# Altium footprint library Hydra_Ref_pcb.PcbLib: 353 footprints (part 7 of 23)
Each footprint in its own frame and in the unit in brackets; x right, y up, seen from the top. Pads: shape width x height; smd on the part's side, far side on the other; paste and mask are expansions set on the pad; w line width, h text height; cw(c..) or ccw(c..) is an arc to the next point about the centre after c.
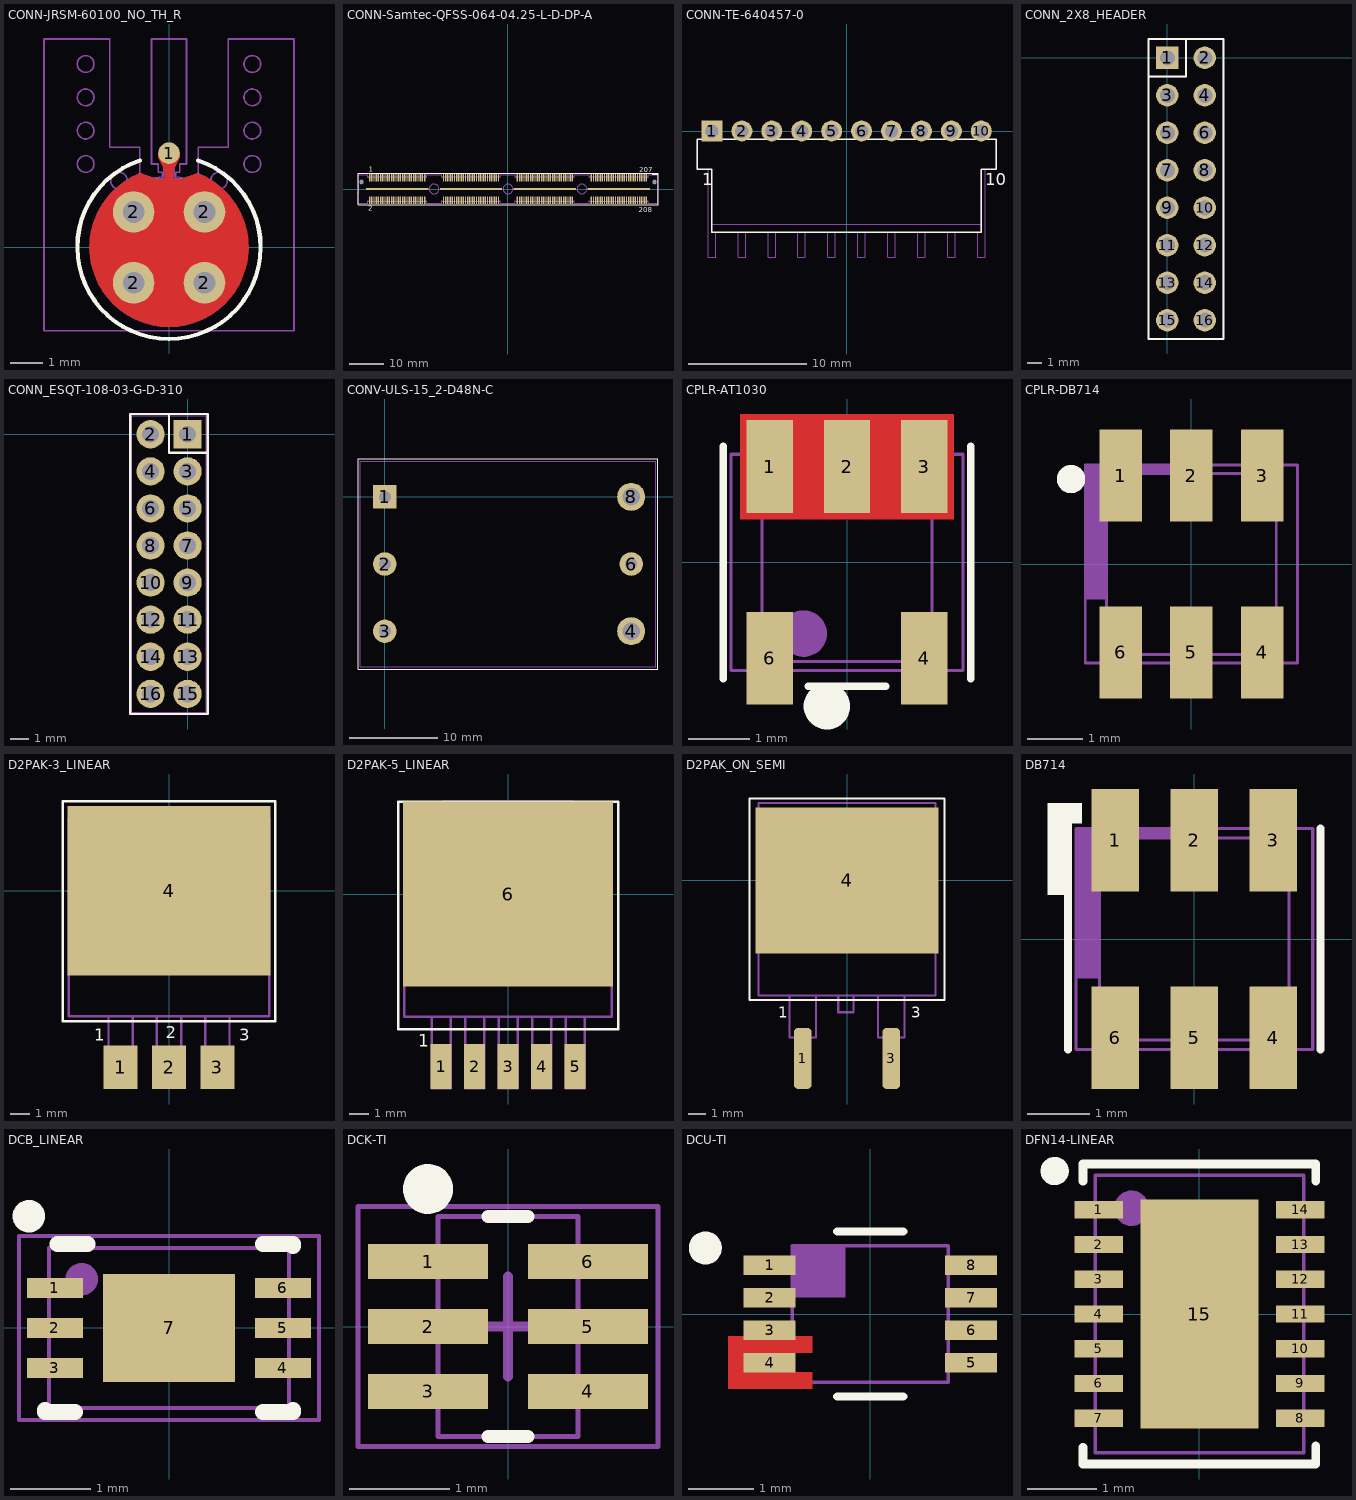
[diagram p6: the footprints below, top view; thin cyan lines are the x and y axes]

## CONN-JRSM-60100_NO_TH_R [mil] ".063\" PCB ONLY-MALE COMPANAR SURFACE MOUNT"
height 116
pads (5):
  round 26 smd paste+0 mask+4: 1(0,113)
  round 50 / inner round 40 / far side round 50 hole 26 mask-25: 2(-42.5,-42.5) 2(-42.5,42.5) 2(42.5,-42.5) 2(42.5,42.5)
Top Layer:
  pour cut-out: -13.5,21.04 -16.91,18.85 -22,12.55 -24.84,4.95 -25.13,-3.15 -22.85,-10.92 -18.23,-17.58 -11.74,-22.44 -4.05,-25 4.05,-25 11.74,-22.44 18.23,-17.58 22.85,-10.92 25.13,-3.15 24.84,4.95 22,12.55 16.91,18.85 13.5,21.04 13.5,82 -13.5,82
  region: -5,92 -13,108 -13,113 0,100 13,113 13,108 5,92 5,70 -5,70
  region: -33.87,88.76 -42.7,85.39 -58.69,75.3 -72.38,62.25 -83.23,46.77 -90.81,29.45 -94.84,10.98 -95.14,-7.93 -91.71,-26.52 -84.69,-44.07 -74.34,-59.9 -61.08,-73.37 -45.43,-83.97 -27.99,-91.27 -9.45,-95 9.45,-95 27.99,-91.27 45.43,-83.97 61.08,-73.37 74.34,-59.9 84.69,-44.07 91.71,-26.52 95.14,-7.93 94.84,10.98 90.81,29.45 83.23,46.77 72.38,62.25 58.69,75.3 42.7,85.39 33.87,88.76 33.87,88.77 13.5,82 13.5,21.04 16.69,18.61 21.72,12.38 24.52,4.89 24.81,-3.1 22.56,-10.78 17.99,-17.36 11.59,-22.15 4,-24.68 -4,-24.68 -11.59,-22.15 -17.99,-17.36 -22.56,-10.78 -24.81,-3.1 -24.52,4.89 -21.72,12.38 -16.69,18.61 -13.5,21.04 -13.5,82
  region: 33.91,88.86 53.03,79.37 67.5,67.5 79.37,53.03 88.19,36.53 93.63,18.62 95.46,0 93.63,-18.62 88.19,-36.53 79.37,-53.03 67.5,-67.5 53.03,-79.37 36.53,-88.19 18.62,-93.63 0,-95.46 -18.62,-93.63 -36.53,-88.19 -44.78,-83.78 -53.03,-79.37 -60.27,-73.44 -67.5,-67.5 -73.44,-60.27 -79.37,-53.03 -83.78,-44.78 -88.19,-36.53 -93.63,-18.62 -94.54,-9.31 -95.46,0 -93.63,18.62 -88.19,36.53 -79.37,53.03 -67.5,67.5 -53.03,79.37 -36.53,88.19 -35.24,50 -55,18.02 -55,-15 -42.5,-42.5 0,-65 42.5,-42.5 55,-13.89 55,18.62 33.96,50
Mid-Layer 6:
  pour cut-out: -53.78,70.4 -55.45,69.73 -57.17,66.56 -56.48,63.03 -53.7,60.74 -51.9,60.74 -51.66,60.74 -51.18,60.78 -50.71,60.88 -50.24,61.01 -50.02,61.1 -48.22,61.73 -44.48,62.47 -40.67,62.48 -36.92,61.77 -35.12,61.16 -34.9,61.07 -34.44,60.94 -33.98,60.85 -33.51,60.8 -33.27,60.8 -31.46,60.8 -28.68,63.11 -28,66.65 -29.74,69.82 -31.42,70.48 -34.09,71.54 -39.74,72.61 -45.48,72.58 -51.12,71.48
  pour cut-out: -14.6,53.78 -15.27,55.45 -18.44,57.17 -21.97,56.48 -24.26,53.7 -24.26,51.9 -24.26,51.66 -24.22,51.18 -24.12,50.71 -23.99,50.24 -23.9,50.02 -23.27,48.22 -22.53,44.48 -22.52,40.67 -23.23,36.92 -23.84,35.12 -23.93,34.9 -24.06,34.44 -24.15,33.98 -24.2,33.51 -24.2,33.27 -24.2,31.46 -21.89,28.68 -18.35,28 -15.18,29.74 -14.52,31.42 -13.46,34.09 -12.39,39.74 -12.42,45.48 -13.52,51.12
  pour cut-out: -31.22,14.6 -29.55,15.27 -27.83,18.44 -28.52,21.97 -31.3,24.26 -33.1,24.26 -33.34,24.26 -33.82,24.22 -34.29,24.12 -34.76,23.99 -34.98,23.9 -36.78,23.27 -40.52,22.53 -44.33,22.52 -48.08,23.23 -49.88,23.84 -50.1,23.93 -50.56,24.06 -51.02,24.15 -51.49,24.2 -51.73,24.2 -53.54,24.2 -56.32,21.89 -56.99,18.35 -55.26,15.18 -53.58,14.52 -50.91,13.46 -45.26,12.39 -39.52,12.42 -33.88,13.52
  pour cut-out: -70.4,31.22 -69.73,29.55 -66.56,27.83 -63.03,28.52 -60.74,31.3 -60.74,33.1 -60.74,33.34 -60.78,33.82 -60.88,34.29 -61.01,34.76 -61.1,34.98 -61.73,36.78 -62.47,40.52 -62.48,44.33 -61.77,48.08 -61.16,49.88 -61.07,50.1 -60.94,50.56 -60.85,51.02 -60.8,51.49 -60.8,51.73 -60.8,53.54 -63.11,56.32 -66.65,56.99 -69.82,55.26 -70.48,53.58 -71.54,50.91 -72.61,45.26 -72.58,39.52 -71.48,33.88
  pour cut-out: 31.22,70.4 29.55,69.73 27.83,66.56 28.52,63.03 31.3,60.74 33.1,60.74 33.34,60.74 33.82,60.78 34.29,60.88 34.76,61.01 34.98,61.1 36.78,61.73 40.52,62.47 44.33,62.48 48.08,61.77 49.88,61.16 50.1,61.07 50.56,60.94 51.02,60.85 51.49,60.8 51.73,60.8 53.54,60.8 56.32,63.11 56.99,66.65 55.26,69.82 53.58,70.48 50.91,71.54 45.26,72.61 39.52,72.58 33.88,71.48
  pour cut-out: 70.4,53.78 69.73,55.45 66.56,57.17 63.03,56.48 60.74,53.7 60.74,51.9 60.74,51.66 60.78,51.18 60.88,50.71 61.01,50.24 61.1,50.02 61.73,48.22 62.47,44.48 62.48,40.67 61.77,36.92 61.16,35.12 61.07,34.9 60.94,34.44 60.85,33.98 60.8,33.51 60.8,33.27 60.8,31.46 63.11,28.68 66.65,28 69.82,29.74 70.48,31.42 71.54,34.09 72.61,39.74 72.58,45.48 71.48,51.12
  pour cut-out: 53.78,14.6 55.45,15.27 57.17,18.44 56.48,21.97 53.7,24.26 51.9,24.26 51.66,24.26 51.18,24.22 50.71,24.12 50.24,23.99 50.02,23.9 48.22,23.27 44.48,22.53 40.67,22.52 36.92,23.23 35.12,23.84 34.9,23.93 34.44,24.06 33.98,24.15 33.51,24.2 33.27,24.2 31.46,24.2 28.68,21.89 28,18.35 29.74,15.18 31.42,14.52 34.09,13.46 39.74,12.39 45.48,12.42 51.12,13.52
  pour cut-out: 14.6,31.22 15.27,29.55 18.44,27.83 21.97,28.52 24.26,31.3 24.26,33.1 24.26,33.34 24.22,33.82 24.12,34.29 23.99,34.76 23.9,34.98 23.27,36.78 22.53,40.52 22.52,44.33 23.23,48.08 23.84,49.88 23.93,50.1 24.06,50.56 24.15,51.02 24.2,51.49 24.2,51.73 24.2,53.54 21.89,56.32 18.35,56.99 15.18,55.26 14.52,53.58 13.46,50.91 12.39,45.26 12.42,39.52 13.52,33.88
  pour cut-out: -53.78,-14.6 -55.45,-15.27 -57.17,-18.44 -56.48,-21.97 -53.7,-24.26 -51.9,-24.26 -51.66,-24.26 -51.18,-24.22 -50.71,-24.12 -50.24,-23.99 -50.02,-23.9 -48.22,-23.27 -44.48,-22.53 -40.67,-22.52 -36.92,-23.23 -35.12,-23.84 -34.9,-23.93 -34.44,-24.06 -33.98,-24.15 -33.51,-24.2 -33.27,-24.2 -31.46,-24.2 -28.68,-21.89 -28,-18.35 -29.74,-15.18 -31.42,-14.52 -34.09,-13.46 -39.74,-12.39 -45.48,-12.42 -51.12,-13.52
  pour cut-out: -14.6,-31.22 -15.27,-29.55 -18.44,-27.83 -21.97,-28.52 -24.26,-31.3 -24.26,-33.1 -24.26,-33.34 -24.22,-33.82 -24.12,-34.29 -23.99,-34.76 -23.9,-34.98 -23.27,-36.78 -22.53,-40.52 -22.52,-44.33 -23.23,-48.08 -23.84,-49.88 -23.93,-50.1 -24.06,-50.56 -24.15,-51.02 -24.2,-51.49 -24.2,-51.73 -24.2,-53.54 -21.89,-56.32 -18.35,-56.99 -15.18,-55.26 -14.52,-53.58 -13.46,-50.91 -12.39,-45.26 -12.42,-39.52 -13.52,-33.88
  pour cut-out: -31.22,-70.4 -29.55,-69.73 -27.83,-66.56 -28.52,-63.03 -31.3,-60.74 -33.1,-60.74 -33.34,-60.74 -33.82,-60.78 -34.29,-60.88 -34.76,-61.01 -34.98,-61.1 -36.78,-61.73 -40.52,-62.47 -44.33,-62.48 -48.08,-61.77 -49.88,-61.16 -50.1,-61.07 -50.56,-60.94 -51.02,-60.85 -51.49,-60.8 -51.73,-60.8 -53.54,-60.8 -56.32,-63.11 -56.99,-66.65 -55.26,-69.82 -53.58,-70.48 -50.91,-71.54 -45.26,-72.61 -39.52,-72.58 -33.88,-71.48
  pour cut-out: -70.4,-53.78 -69.73,-55.45 -66.56,-57.17 -63.03,-56.48 -60.74,-53.7 -60.74,-51.9 -60.74,-51.66 -60.78,-51.18 -60.88,-50.71 -61.01,-50.24 -61.1,-50.02 -61.73,-48.22 -62.47,-44.48 -62.48,-40.67 -61.77,-36.92 -61.16,-35.12 -61.07,-34.9 -60.94,-34.44 -60.85,-33.98 -60.8,-33.51 -60.8,-33.27 -60.8,-31.46 -63.11,-28.68 -66.65,-28 -69.82,-29.74 -70.48,-31.42 -71.54,-34.09 -72.61,-39.74 -72.58,-45.48 -71.48,-51.12
  pour cut-out: 31.22,-14.6 29.55,-15.27 27.83,-18.44 28.52,-21.97 31.3,-24.26 33.1,-24.26 33.34,-24.26 33.82,-24.22 34.29,-24.12 34.76,-23.99 34.98,-23.9 36.78,-23.27 40.52,-22.53 44.33,-22.52 48.08,-23.23 49.88,-23.84 50.1,-23.93 50.56,-24.06 51.02,-24.15 51.49,-24.2 51.73,-24.2 53.54,-24.2 56.32,-21.89 56.99,-18.35 55.26,-15.18 53.58,-14.52 50.91,-13.46 45.26,-12.39 39.52,-12.42 33.88,-13.52
  pour cut-out: 70.4,-31.22 69.73,-29.55 66.56,-27.83 63.03,-28.52 60.74,-31.3 60.74,-33.1 60.74,-33.34 60.78,-33.82 60.88,-34.29 61.01,-34.76 61.1,-34.98 61.73,-36.78 62.47,-40.52 62.48,-44.33 61.77,-48.08 61.16,-49.88 61.07,-50.1 60.94,-50.56 60.85,-51.02 60.8,-51.49 60.8,-51.73 60.8,-53.54 63.11,-56.32 66.65,-56.99 69.82,-55.26 70.48,-53.58 71.54,-50.91 72.61,-45.26 72.58,-39.52 71.48,-33.88
  pour cut-out: 53.78,-70.4 55.45,-69.73 57.17,-66.56 56.48,-63.03 53.7,-60.74 51.9,-60.74 51.66,-60.74 51.18,-60.78 50.71,-60.88 50.24,-61.01 50.02,-61.1 48.22,-61.73 44.48,-62.47 40.67,-62.48 36.92,-61.77 35.12,-61.16 34.9,-61.07 34.44,-60.94 33.98,-60.85 33.51,-60.8 33.27,-60.8 31.46,-60.8 28.68,-63.11 28,-66.65 29.74,-69.82 31.42,-70.48 34.09,-71.54 39.74,-72.61 45.48,-72.58 51.12,-71.48
  pour cut-out: 14.6,-53.78 15.27,-55.45 18.44,-57.17 21.97,-56.48 24.26,-53.7 24.26,-51.9 24.26,-51.66 24.22,-51.18 24.12,-50.71 23.99,-50.24 23.9,-50.02 23.27,-48.22 22.53,-44.48 22.52,-40.67 23.23,-36.92 23.84,-35.12 23.93,-34.9 24.06,-34.44 24.15,-33.98 24.2,-33.51 24.2,-33.27 24.2,-31.46 21.89,-28.68 18.35,-28 15.18,-29.74 14.52,-31.42 13.46,-34.09 12.39,-39.74 12.42,-45.48 13.52,-51.12
Top Overlay:
  lines w5: -34.9,104.32 ccw(c0,0) 34.9,104.32
Top Paste:
  region: -13,113 -13,108 -9,100 9,100 13,108 13,113
Top Solder:
  circle w20: c0,0 r10
  rectangle: -8.5,0 8.5,45
  rectangle: -8.5,81 8,88.76
  lines w20: -39.66,88.04 ccw(c0,0) 39.66,88.04
InternalPlane 3:
  lines w10: -65.82,-33.27 ccw(c-42.5,-42.5) -65.75,-51.9 ; -65.82,51.73 ccw(c-42.5,42.5) -65.75,33.1 ; -51.9,-19.25 cw(c-42.5,-42.5) -33.27,-19.18 ; -51.9,65.75 cw(c-42.5,42.5) -33.27,65.82 ; -51.73,-65.82 ccw(c-42.5,-42.5) -33.1,-65.75 ; -51.73,19.18 ccw(c-42.5,42.5) -33.1,19.25 ; -19.25,-33.1 cw(c-42.5,-42.5) -19.18,-51.73 ; -19.25,51.9 cw(c-42.5,42.5) -19.18,33.27 ; 19.18,-33.27 ccw(c42.5,-42.5) 19.25,-51.9 ; 19.18,51.73 ccw(c42.5,42.5) 19.25,33.1 ; 33.1,-19.25 cw(c42.5,-42.5) 51.73,-19.18 ; 33.1,65.75 cw(c42.5,42.5) 51.73,65.82 ; 33.27,-65.82 ccw(c42.5,-42.5) 51.9,-65.75 ; 33.27,19.18 ccw(c42.5,42.5) 51.9,19.25 ; 65.75,-33.1 cw(c42.5,-42.5) 65.82,-51.73 ; 65.75,51.9 cw(c42.5,42.5) 65.82,33.27
Internal Plane 2:
  lines w10: -65.82,-33.27 ccw(c-42.5,-42.5) -65.75,-51.9 ; -65.82,51.73 ccw(c-42.5,42.5) -65.75,33.1 ; -51.9,-19.25 cw(c-42.5,-42.5) -33.27,-19.18 ; -51.9,65.75 cw(c-42.5,42.5) -33.27,65.82 ; -51.73,-65.82 ccw(c-42.5,-42.5) -33.1,-65.75 ; -51.73,19.18 ccw(c-42.5,42.5) -33.1,19.25 ; -19.25,-33.1 cw(c-42.5,-42.5) -19.18,-51.73 ; -19.25,51.9 cw(c-42.5,42.5) -19.18,33.27 ; 19.18,-33.27 ccw(c42.5,-42.5) 19.25,-51.9 ; 19.18,51.73 ccw(c42.5,42.5) 19.25,33.1 ; 33.1,-19.25 cw(c42.5,-42.5) 51.73,-19.18 ; 33.1,65.75 cw(c42.5,42.5) 51.73,65.82 ; 33.27,-65.82 ccw(c42.5,-42.5) 51.9,-65.75 ; 33.27,19.18 ccw(c42.5,42.5) 51.9,19.25 ; 65.75,-33.1 cw(c42.5,-42.5) 65.82,-51.73 ; 65.75,51.9 cw(c42.5,42.5) 65.82,33.27
Internal Plane 4:
  lines w10: -65.82,-33.27 ccw(c-42.5,-42.5) -65.75,-51.9 ; -65.82,51.73 ccw(c-42.5,42.5) -65.75,33.1 ; -51.9,-19.25 cw(c-42.5,-42.5) -33.27,-19.18 ; -51.9,65.75 cw(c-42.5,42.5) -33.27,65.82 ; -51.73,-65.82 ccw(c-42.5,-42.5) -33.1,-65.75 ; -51.73,19.18 ccw(c-42.5,42.5) -33.1,19.25 ; -19.25,-33.1 cw(c-42.5,-42.5) -19.18,-51.73 ; -19.25,51.9 cw(c-42.5,42.5) -19.18,33.27 ; 19.18,-33.27 ccw(c42.5,-42.5) 19.25,-51.9 ; 19.18,51.73 ccw(c42.5,42.5) 19.25,33.1 ; 33.1,-19.25 cw(c42.5,-42.5) 51.73,-19.18 ; 33.1,65.75 cw(c42.5,42.5) 51.73,65.82 ; 33.27,-65.82 ccw(c42.5,-42.5) 51.9,-65.75 ; 33.27,19.18 ccw(c42.5,42.5) 51.9,19.25 ; 65.75,-33.1 cw(c42.5,-42.5) 65.82,-51.73 ; 65.75,51.9 cw(c42.5,42.5) 65.82,33.27
9 Top Assy:
  circle w2: c0,0 r85
  lines w2: -6,85 6,85 6,118 -6,118 -6,85
  text ".Designator" at -70,-20.11 h40
13 Top 3D Bodies:
  circle w2: c0,0 r85
  lines w2: -6,85 -6,113 6,113 6,85 -6,85
Mechanical 30:
  circle w2: c-42.5,42.5 r14
  circle w2: c-42.5,-42.5 r14
  circle w2: c42.5,-42.5 r14
  circle w2: c42.5,42.5 r14
  circle w2: c0,-60 r10
  circle w2: c60,0 r10
  circle w2: c-60,0 r10
  circle w2: c60,80 r10
  circle w2: c-100,220 r10
  circle w2: c-100,180 r10
  circle w2: c-100,140 r10
  circle w2: c100,100 r10
  circle w2: c100,140 r10
  circle w2: c100,180 r10
  circle w2: c100,220 r10
  circle w2: c-100,100 r10
  circle w2: c-60,80 r10
  lines w0: -33.87,88.76 ccw(c0,0) 33.87,88.76 13.5,82 13.5,21.04 cw(c0,0) -13.5,21.04 -13.5,82 -33.87,88.77
  lines w2: -13.5,82 -13.5,21.04 ccw(c0,0) 13.5,21.04 13.5,82 ; -13.5,82 -35,82 -35,120 -71,120 -71,250 -150,250 -150,-100 150,-100 150,250 71,250 71,120 35,120 35,82 13.5,82 ; -13.5,82 13.5,82 ; -21,100 -21,250 21,250 21,100 13,100 13,90 8,90 8,55 -8,55 -8,90 -13,90 -13,100 -21,100
3D body: height 108, standoff -75, extent -82.49,-82.5 82.51,112.99

## CONN-Samtec-QFSS-064-04.25-L-D-DP-A [mil] "CONN-Samtec-QFSS-064-04.25-L-D-DP-A"
height 293
pads (214):
  rect 16x85 smd mask+2: 1(-1572.5,127.5) 2(-1572.5,-127.5) 3(-1547.5,127.5) 4(-1547.5,-127.5) 5(-1522.5,127.5) 6(-1522.5,-127.5) 7(-1497.5,127.5) 8(-1497.5,-127.5) 9(-1472.5,127.5) 10(-1472.5,-127.5) 11(-1447.5,127.5) 12(-1447.5,-127.5) 13(-1422.5,127.5) 14(-1422.5,-127.5) 15(-1397.5,127.5) 16(-1397.5,-127.5) 17(-1372.5,127.5) 18(-1372.5,-127.5) 19(-1347.5,127.5) 20(-1347.5,-127.5) 21(-1322.5,127.5) 22(-1322.5,-127.5) 23(-1297.5,127.5) 24(-1297.5,-127.5) 25(-1272.5,127.5) 26(-1272.5,-127.5) 27(-1247.5,127.5) 28(-1247.5,-127.5) 29(-1222.5,127.5) 30(-1222.5,-127.5) 31(-1197.5,127.5) 32(-1197.5,-127.5) 33(-1172.5,127.5) 34(-1172.5,-127.5) 35(-1147.5,127.5) 36(-1147.5,-127.5) 37(-1122.5,127.5) 38(-1122.5,-127.5) 39(-1097.5,127.5) 40(-1097.5,-127.5) 41(-1072.5,127.5) 42(-1072.5,-127.5) 43(-1047.5,127.5) 44(-1047.5,-127.5) 45(-1022.5,127.5) 46(-1022.5,-127.5) 47(-997.5,127.5) 48(-997.5,-127.5) 49(-972.5,127.5) 50(-972.5,-127.5) 51(-947.5,127.5) 52(-947.5,-127.5) 53(-732.5,127.5) 54(-732.5,-127.5) 55(-707.5,127.5) 56(-707.5,-127.5) 57(-682.5,127.5) 58(-682.5,-127.5) 59(-657.5,127.5) 60(-657.5,-127.5) 61(-632.5,127.5) 62(-632.5,-127.5) 63(-607.5,127.5) 64(-607.5,-127.5) 65(-582.5,127.5) 66(-582.5,-127.5) 67(-557.5,127.5) 68(-557.5,-127.5) 69(-532.5,127.5) 70(-532.5,-127.5) 71(-507.5,127.5) 72(-507.5,-127.5) 73(-482.5,127.5) 74(-482.5,-127.5) 75(-457.5,127.5) 76(-457.5,-127.5) 77(-432.5,127.5) 78(-432.5,-127.5) 79(-407.5,127.5) 80(-407.5,-127.5) 81(-382.5,127.5) 82(-382.5,-127.5) 83(-357.5,127.5) 84(-357.5,-127.5) 85(-332.5,127.5) 86(-332.5,-127.5) 87(-307.5,127.5) 88(-307.5,-127.5) 89(-282.5,127.5) 90(-282.5,-127.5) 91(-257.5,127.5) 92(-257.5,-127.5) 93(-232.5,127.5) 94(-232.5,-127.5) 95(-207.5,127.5) 96(-207.5,-127.5) 97(-182.5,127.5) 98(-182.5,-127.5) 99(-157.5,127.5) 100(-157.5,-127.5) 101(-132.5,127.5) 102(-132.5,-127.5) 103(-107.5,127.5) 104(-107.5,-127.5) 105(107.5,127.5) 106(107.5,-127.5) 107(132.5,127.5) 108(132.5,-127.5) 109(157.5,127.5) 110(157.5,-127.5) 111(182.5,127.5) 112(182.5,-127.5) 113(207.5,127.5) 114(207.5,-127.5) 115(232.5,127.5) 116(232.5,-127.5) 117(257.5,127.5) 118(257.5,-127.5) 119(282.5,127.5) 120(282.5,-127.5) 121(307.5,127.5) 122(307.5,-127.5) 123(332.5,127.5) 124(332.5,-127.5) 125(357.5,127.5) 126(357.5,-127.5) 127(382.5,127.5) 128(382.5,-127.5) 129(407.5,127.5) 130(407.5,-127.5) 131(432.5,127.5) 132(432.5,-127.5) 133(457.5,127.5) 134(457.5,-127.5) 135(482.5,127.5) 136(482.5,-127.5) 137(507.5,127.5) 138(507.5,-127.5) 139(532.5,127.5) 140(532.5,-127.5) 141(557.5,127.5) 142(557.5,-127.5) 143(582.5,127.5) 144(582.5,-127.5) 145(607.5,127.5) 146(607.5,-127.5) 147(632.5,127.5) 148(632.5,-127.5) 149(657.5,127.5) 150(657.5,-127.5) 151(682.5,127.5) 152(682.5,-127.5) 153(707.5,127.5) 154(707.5,-127.5) 155(732.5,127.5) 156(732.5,-127.5) 157(947.5,127.5) 158(947.5,-127.5) 159(972.5,127.5) 160(972.5,-127.5) 161(997.5,127.5) 162(997.5,-127.5) 163(1022.5,127.5) 164(1022.5,-127.5) 165(1047.5,127.5) 166(1047.5,-127.5) 167(1072.5,127.5) 168(1072.5,-127.5) 169(1097.5,127.5) 170(1097.5,-127.5) 171(1122.5,127.5) 172(1122.5,-127.5) 173(1147.5,127.5) 174(1147.5,-127.5) 175(1172.5,127.5) 176(1172.5,-127.5) 177(1197.5,127.5) 178(1197.5,-127.5) 179(1222.5,127.5) 180(1222.5,-127.5) 181(1247.5,127.5) 182(1247.5,-127.5) 183(1272.5,127.5) 184(1272.5,-127.5) 185(1297.5,127.5) 186(1297.5,-127.5) 187(1322.5,127.5) 188(1322.5,-127.5) 189(1347.5,127.5) 190(1347.5,-127.5) 191(1372.5,127.5) 192(1372.5,-127.5) 193(1397.5,127.5) 194(1397.5,-127.5) 195(1422.5,127.5) 196(1422.5,-127.5) 197(1447.5,127.5) 198(1447.5,-127.5) 199(1472.5,127.5) 200(1472.5,-127.5) 201(1497.5,127.5) 202(1497.5,-127.5) 203(1522.5,127.5) 204(1522.5,-127.5) 205(1547.5,127.5) 206(1547.5,-127.5) 207(1572.5,127.5) 208(1572.5,-127.5)
  rect 710x25 smd mask+2: A(-1260,0) B(-420,0) C(420,0) D(1260,0)
  round 20 hole 46 unplated mask+20: MH_E(-1665,80) MH_F(1665,80)
Top Overlay:
  lines w5: 1641,170 1704,170 ; -1704,-180 -1704,180 1705,180 1705,-180 -1704,-180
  text "1" at -1583,194 h60
  text "2" at -1588.5,-246 h60
  text "208" at 1484.5,-262 h60
  text "207" at 1492.5,189 h60
9 Top Assy:
  circle w2: c1665,80 r20
  circle w2: c-1665,80 r20
  circle w2: c-840,0 r55
  circle w2: c0,0 r55
  circle w2: c840,0 r55
  lines w2: -1700,-160 -1700,-40 -1695,-40 -1695,40 -1700,40 -1700,160 -1594.5,160 -1594.5,133 -1584.5,133 -1584.5,138.87 -935.5,138.87 -935.5,133 -925.5,133 -925.5,160 -754.5,160 -754.5,133 -744.5,133 -744.5,138.87 -95.5,138.87 -95.5,133 -85.5,133 -85.5,160 85.5,160 85.5,133 95.5,133 95.5,138.87 744.5,138.87 744.5,133 754.5,133 754.5,160 925.5,160 925.5,133 935.5,133 935.5,138.87 1584.5,138.87 1584.5,133 1594.5,133 1594.5,160 1700,160 1700,-160 1594.5,-160 1594.5,-133 1584.5,-133 1584.5,-138.87 935.5,-138.87 935.5,-133 925.5,-133 925.5,-160 754.5,-160 754.5,-133 744.5,-133 744.5,-138.87 95.5,-138.87 95.5,-133 85.5,-133 85.5,-160 -85.5,-160 -85.5,-133 -95.5,-133 -95.5,-138.87 -744.5,-138.87 -744.5,-133 -754.5,-133 -754.5,-160 -925.5,-160 -925.5,-133 -935.5,-133 -935.5,-138.87 -1584.5,-138.87 -1584.5,-133 -1594.5,-133 -1594.5,-160 -1700,-160
  text ".Designator" at 58.23,-5.59 h31.5
Mechanical 30:
  circle w2: c-1665,80 r20
  circle w2: c1665,80 r20
  circle w2: c-840,0 r55
  circle w2: c0,0 r55
  circle w2: c840,0 r55
  lines w2: -1700,-160 -1700,-40 -1695,-40 -1695,40 -1700,40 -1700,160 -1594.5,160 -1594.5,133 -1584.5,133 -1584.5,138.87 -935.5,138.87 -935.5,133 -925.5,133 -925.5,160 -754.5,160 -754.5,133 -744.5,133 -744.5,138.87 -95.5,138.87 -95.5,133 -85.5,133 -85.5,160 85.5,160 85.5,133 95.5,133 95.5,138.87 744.5,138.87 744.5,133 754.5,133 754.5,160 925.5,160 925.5,133 935.5,133 935.5,138.87 1584.5,138.87 1584.5,133 1594.5,133 1594.5,160 1700,160 1700,-160 1594.5,-160 1594.5,-133 1584.5,-133 1584.5,-138.87 935.5,-138.87 935.5,-133 925.5,-133 925.5,-160 754.5,-160 754.5,-133 744.5,-133 744.5,-138.87 95.5,-138.87 95.5,-133 85.5,-133 85.5,-160 -85.5,-160 -85.5,-133 -95.5,-133 -95.5,-138.87 -744.5,-138.87 -744.5,-133 -754.5,-133 -754.5,-160 -925.5,-160 -925.5,-133 -935.5,-133 -935.5,-138.87 -1584.5,-138.87 -1584.5,-133 -1594.5,-133 -1594.5,-160 -1700,-160
3D body: height 0, standoff -35, extent -1684.98,60.02 -1645.02,99.98
3D body: height 0, standoff -35, extent 1645.02,60.02 1684.98,99.98
3D body: height 348.6, standoff 0, extent -894.98,-54.98 -785.02,54.98
3D body: height 348.6, standoff 0, extent 785.02,-54.98 894.98,54.98
3D body: height 348.6, standoff 0, extent -54.98,-54.98 54.98,54.98
3D body: height 293, standoff 0, extent -1699.98,-159.98 1699.98,159.98

## CONN-TE-640457-0 [mil] "LOCKING HEADER;.1CTR;10PIN;RA;TIN"
height 420
pads (10):
  rect 70x70 hole 45: 1(-450,0)
  round 70 hole 45: 2(-350,0) 3(-250,0) 4(-150,0) 5(-50,0) 6(50,0) 7(150,0) 8(250,0) 9(350,0) 10(450,0)
Top Overlay:
  lines w5: -500,-127.5 -500,-27.5 500,-27.5 500,-127.5 450,-127.5 450,-337.5 -450,-337.5 -450,-127.5 -500,-127.5
  text "10" at 462.5,-181 h40
  text "1" at -481.66,-181 h40
9 Top Assy:
  lines w2: -462.5,-127.5 -462.5,-422.5 -437.5,-422.5 -437.5,-337.5 ; -462.5,-27.5 -462.5,12.5 -437.5,12.5 -437.5,-27.5 ; -450,-312.09 450,-312.09 ; -362.5,-337.5 -362.5,-422.5 -337.5,-422.5 -337.5,-337.5 ; -362.5,-27.5 -362.5,12.5 -337.5,12.5 -337.5,-27.5 ; -262.5,-337.5 -262.5,-422.5 -237.5,-422.5 -237.5,-337.5 ; -262.5,-27.5 -262.5,12.5 -237.5,12.5 -237.5,-27.5 ; -162.5,-337.5 -162.5,-422.5 -137.5,-422.5 -137.5,-337.5 ; -162.5,-27.5 -162.5,12.5 -137.5,12.5 -137.5,-27.5 ; -62.5,-337.5 -62.5,-422.5 -37.5,-422.5 -37.5,-337.5 ; -62.5,-27.5 -62.5,12.5 -37.5,12.5 -37.5,-27.5 ; 37.5,-337.5 37.5,-422.5 62.5,-422.5 62.5,-337.5 ; 37.5,-27.5 37.5,12.5 62.5,12.5 62.5,-27.5 ; 137.5,-337.5 137.5,-422.5 162.5,-422.5 162.5,-337.5 ; 137.5,-27.5 137.5,12.5 162.5,12.5 162.5,-27.5 ; 237.5,-337.5 237.5,-422.5 262.5,-422.5 262.5,-337.5 ; 237.5,-27.5 237.5,12.5 262.5,12.5 262.5,-27.5 ; 337.5,-337.5 337.5,-422.5 362.5,-422.5 362.5,-337.5 ; 337.5,-27.5 337.5,12.5 362.5,12.5 362.5,-27.5 ; 437.5,-337.5 437.5,-422.5 462.5,-422.5 462.5,-127.5 ; 437.5,-27.5 437.5,12.5 462.5,12.5 462.5,-27.5 ; -500,-127.5 -450,-127.5 -450,-337.5 450,-337.5 450,-127.5 500,-127.5 500,-27.5 -500,-27.5 -500,-127.5
  text ".Des" at -140,-130 h80
Mechanical 30:
  lines w2: -462.5,-127.5 -462.5,-422.5 -437.5,-422.5 -437.5,-337.5 ; -462.5,-27.5 -462.5,12.5 -437.5,12.5 -437.5,-27.5 ; -450,-312.09 450,-312.09 ; -362.5,-337.5 -362.5,-422.5 -337.5,-422.5 -337.5,-337.5 ; -362.5,-27.5 -362.5,12.5 -337.5,12.5 -337.5,-27.5 ; -262.5,-337.5 -262.5,-422.5 -237.5,-422.5 -237.5,-337.5 ; -262.5,-27.5 -262.5,12.5 -237.5,12.5 -237.5,-27.5 ; -162.5,-337.5 -162.5,-422.5 -137.5,-422.5 -137.5,-337.5 ; -162.5,-27.5 -162.5,12.5 -137.5,12.5 -137.5,-27.5 ; -62.5,-337.5 -62.5,-422.5 -37.5,-422.5 -37.5,-337.5 ; -62.5,-27.5 -62.5,12.5 -37.5,12.5 -37.5,-27.5 ; 37.5,-337.5 37.5,-422.5 62.5,-422.5 62.5,-337.5 ; 37.5,-27.5 37.5,12.5 62.5,12.5 62.5,-27.5 ; 137.5,-337.5 137.5,-422.5 162.5,-422.5 162.5,-337.5 ; 137.5,-27.5 137.5,12.5 162.5,12.5 162.5,-27.5 ; 237.5,-337.5 237.5,-422.5 262.5,-422.5 262.5,-337.5 ; 237.5,-27.5 237.5,12.5 262.5,12.5 262.5,-27.5 ; 337.5,-337.5 337.5,-422.5 362.5,-422.5 362.5,-337.5 ; 337.5,-27.5 337.5,12.5 362.5,12.5 362.5,-27.5 ; 437.5,-337.5 437.5,-422.5 462.5,-422.5 462.5,-127.5 ; 437.5,-27.5 437.5,12.5 462.5,12.5 462.5,-27.5 ; -500,-127.5 -500,-27.5 500,-27.5 500,-127.5 450,-127.5 450,-337.5 -450,-337.5 -450,-127.5 -500,-127.5
3D body: height 230.6, standoff -139.4, extent -499.99,-422.5 500.01,12.5

## CONN_2X8_HEADER [mil] "STRIPLINE HEADER;16PINS;.37H;.1CTR;GOLD"
height 320
pads (16):
  rect 60x60 hole 40: 1(0,0)
  round 60 hole 40: 2(100,0) 3(0,-100) 4(100,-100) 5(0,-200) 6(100,-200) 7(0,-300) 8(100,-300) 9(0,-400) 10(100,-400) 11(0,-500) 12(100,-500) 13(0,-600) 14(100,-600) 15(0,-700) 16(100,-700)
Top Overlay:
  lines w1: -50,50 150,50
  lines w5: -50,-50 50,-50 50,50 ; -50,-750 150,-750 150,50 -50,50 -50,-750
9 Top Assy:
  lines w2: -50,-50 50,-50 50,50 ; -50,-750 150,-750 150,50 -50,50 -50,-750
  text ".Designator" at 70,-455 h60
  text "2" at 170,-25 h50
  text "1" at -90,-25 h50
15 Top Optical Placement:
  lines w2: -50,-50 50,-50 50,50 ; -50,-750 150,-750 150,50 -50,50 -50,-750

## CONN_ESQT-108-03-G-D-310 [mil] "SAMTEC-STRIPLINE SOCKET;2MM CTR;2X8 PIN;.31\" HT"
height 408
pads (16):
  rect 60x60 / inner rect 50x50 / far side rect 60x60 hole 36: 1(0,0)
  round 60 / inner round 50 / far side round 60 hole 36: 2(-78.74,0) 3(0,-78.74) 4(-78.74,-78.74) 5(0,-157.48) 6(-78.74,-157.48) 7(0,-236.22) 8(-78.74,-236.22) 9(0,-314.96) 10(-78.74,-314.96) 11(0,-393.7) 12(-78.74,-393.7) 13(0,-472.44) 14(-78.74,-472.44) 15(0,-551.18) 16(-78.74,-551.18)
Top Overlay:
  lines w5: -39.37,43 -39.37,-39.37 43,-39.37 ; -122,-594 43,-594 43,43 -122,43 -122,-594
Top Solder:
  drawing of 17 lines, arcs and shapes, not listed
9 Top Assy:
  lines w2: -39.37,39.37 -39.37,-39.37 39.37,-39.37 ; -118.11,-590.55 -118.11,39.37 39.37,39.37 39.37,-590.55 -118.11,-590.55
  text "1" at 19.55,27.84 h50
  text "2" at -77.09,27.84 h50
  text ".Designator" at 65,-145 h35
3D body: height 250, standoff 0, extent -118.11,-590.55 38.97,39.37

## CONV-ULS-15_2-D48N-C [mil] "1.3x0.9x.036\" convetor -muRata"
height 380
pads (6):
  rect 105x105 hole 54: 1(0,0)
  round 105 hole 54: 2(0,-300) 3(0,-600) 6(1100,-300)
  round 125 hole 77: 4(1100,-600) 8(1100,0)
Top Overlay:
  lines w5: -120,-770 1220,-770 1220,170 -120,170 -120,-770
9 Top Assy:
  lines w2: -110,-760 1210,-760 1210,160 -110,160 -110,-760
  text ".Designator" at 350,-330 h60
3D body: height 155, standoff 0, extent -150,-800 1250,200

## CPLR-AT1030 [mil] ".150x.166x.150\" 5pin Derectional Coupler- Mini-Circuit"
height 155
pads (5):
  rect 30x60 smd: 1(-50,62) 2(0,62) 3(50,62) 4(50,-62) 6(-50,-62)
Top Layer:
  pour cut-out: -69,96 69,96 69,28 -69,28
Top Overlay:
  circle w20: c-13,-93 r5
  lines w5: -80,-75 -80,75 ; -25,-80 25,-80 ; 80,-75 80,75
9 Top Assy:
  circle w20: c-28,-46 r5
  lines w2: -60,-70 -75,-70 -75,70 -60,70 ; -55,-60 -60,-60 -60,-80 -40,-80 -40,-64 ; -55,60 -60,60 -60,80 -40,80 -40,64 ; -40,-70 40,-70 ; -40,70 -10,70 ; -10,64 -10,80 10,80 10,64 ; 10,70 40,70 ; 40,-64 40,-80 60,-80 60,-60 55,-60 ; 40,64 40,80 60,80 60,60 55,60 ; 60,-70 75,-70 75,70 60,70 ; -55,-64 -55,64 55,64 55,-64 -55,-64
  text ".Designator" at 34,-57 h33
3D body: height 155, standoff 0, extent -101,-105 100,105

## CPLR-DB714 [mil] ".150x.160x.160\" 6pin Derectional Coupler- Mini-Circuit"
height 160
pads (6):
  rect 30x65 smd: 1(-50,62.5) 2(0,62.5) 3(50,62.5) 4(50,-62.5) 5(0,-62.5) 6(-50,-62.5)
Top Overlay:
  circle w10: c-85,60 r5
Top Solder:
  pour cut-out: -76,106 76,106 76,-106 -76,-106
9 Top Assy:
  rectangle: -75,-25 -60,70
  rectangle: -39,65 -10,70
  lines w2: -60,-70 -75,-70 -75,70 -60,70 ; -40,-70 -10,-70 ; -40,-64 -40,-80 -60,-80 -60,-64 ; -40,64 -40,80 -60,80 -60,64 ; -40,70 -10,70 ; -10,-64 -10,-80 10,-80 10,-64 ; -10,64 -10,80 10,80 10,64 ; 10,-70 40,-70 ; 10,70 40,70 ; 40,-64 40,-80 60,-80 60,-64 ; 40,64 40,80 60,80 60,64 ; 60,-70 75,-70 75,70 60,70 ; -60,-64 60,-64 ; -60,-64 -60,64 ; -60,64 60,64 ; 60,-64 60,64
  text ".Designator" at 15,-58 h33
3D body: height 160, standoff 25, extent -60,-64 60,64
3D body: height 25, standoff 0, extent -75,-70 75,70
3D body: height 8, standoff 0, extent 36,-80 64,-40
3D body: height 8, standoff 0, extent -14,-80 14,-40
3D body: height 8, standoff 0, extent -64,-80 -36,-40
3D body: height 8, standoff 0, extent 36,40 64,80
3D body: height 8, standoff 0, extent -14,40 14,80
3D body: height 8, standoff 0, extent -64,40 -36,80

## D2PAK-3_LINEAR [mil]
height 180
pads (4):
  rect 70x90 smd: 1(-100,-365) 2(0,-365) 3(100,-365)
  rect 420x350 smd: 4(0,0)
Top Overlay:
  lines w5: -220,-270 -220,185 220,185 220,-270 -220,-270
  text "1" at -155,-310 h25
  text "3" at 145,-310 h25
  text "2" at -7,-305 h25
9 Top Assy:
  lines w5: -207.5,110 207.5,110 207.5,-135 ; -150,-112.5 -150,-135 -142.5,-135 ; -150,-92.5 -150,-70 ; -150,-50 -150,-27.5 ; -150,-7.5 -150,15 ; -150,35 -150,57.5 ; -150,77.5 -150,100 ; -125,-405 -125,-355 -125,-260 ; -125,-404 -75,-404 -75,-355 -75,-260 ; -125,-354 -75,-354 ; -122.5,-135 -100,-135 ; -80,-135 -57.5,-135 ; -37.5,-135 -15,-135 ; -25,-354 25,-354 ; -25,-260 -25,-355 -25,-404 25,-404 25,-355 25,-260 ; 5,-135 27.5,-135 ; 47.5,-135 70,-135 ; 75,-354 125,-354 ; 75,-260 75,-355 75,-404 125,-404 125,-355 125,-260 ; 90,-135 112.5,-135 ; 132.5,-135 150,-135 150,-112.5 ; 150,-92.5 150,-70 ; 150,-50 150,-27.5 ; 150,-7.5 150,15 ; 150,35 150,57.5 ; 150,77.5 150,100 ; -207.5,-260 207.5,-260 207.5,149 128,170 -128,170 -207.5,149 -207.5,-260
  text ".Designator" at -90,-35 h30
  text "2" at -5,-405 h20
  text "3" at 90,-409.5 h20
  text "1" at -105,-407.5 h20
3D body: height 180, standoff 0.01, extent -208,-260 207.5,110
3D body: height 55, standoff 0.01, extent -207.5,110 207.5,170

## D2PAK-5_LINEAR [mil]
height 180
pads (6):
  rect 42x90 smd: 1(-134,-345) 2(-67,-345) 3(0,-345) 4(67,-345) 5(134,-345)
  rect 420x370 smd: 6(0,0)
Top Overlay:
  lines w5: -220,-270 220,-270 220,185 -220,185 -220,-270
  text "1" at -180,-305 h25
9 Top Assy:
  lines w5: -207.5,125 207.5,125 207.5,-120 ; -153,-339 -115,-339 ; -153,-245 -153,-340 -153,-388 -115,-388 -115,-340 -115,-245 ; -150,-97.5 -150,-120 -142.5,-120 ; -150,-77.5 -150,-55 ; -150,-35 -150,-12.5 ; -150,7.5 -150,30 ; -150,50 -150,72.5 ; -150,92.5 -150,115 ; -122.5,-120 -100,-120 ; -86,-339 -48,-339 ; -86,-245 -86,-340 -86,-388 -48,-388 -48,-340 -48,-245 ; -80,-120 -57.5,-120 ; -37.5,-120 -15,-120 ; -19,-339 19,-339 ; -19,-245 -19,-340 -19,-388 19,-388 19,-340 19,-245 ; 5,-120 27.5,-120 ; 47.5,-120 70,-120 ; 48,-339 86,-339 ; 48,-245 48,-340 48,-388 86,-388 86,-340 86,-245 ; 90,-120 112.5,-120 ; 115,-339 153,-339 ; 115,-245 115,-340 115,-388 153,-388 153,-340 153,-245 ; 132.5,-120 150,-120 150,-97.5 ; 150,-77.5 150,-55 ; 150,-35 150,-12.5 ; 150,7.5 150,30 ; 150,50 150,72.5 ; 150,92.5 150,115 ; -207.5,-245 -207.5,164 -128,185 128,185 207.5,164 207.5,-245 -207.5,-245
  text "3" at -5,-415 h20
  text "2" at -75,-415 h20
  text ".Designator" at -90,-20 h30
  text "1" at -140,-415 h20
  text "4" at 60,-415 h20
  text "5" at 128,-415 h20
3D body: height 55, standoff 0.01, extent -207.5,110 207.5,170
3D body: height 180, standoff 0.01, extent -208,-260 207.5,110

## D2PAK_ON_SEMI [mil]
pads (3):
  rrect50% 40x137.95 smd: 1(-100,-402.09) 3(100,-402.09)
  rect 412.99x329.92 smd: 4(0,0)
Top Overlay:
  lines w5: -220,-270 220,-270 220,185 -220,185 -220,-270
  text "3" at 145,-310 h25
  text "1" at -155,-310 h25
9 Top Assy:
  lines w5: -130,-260 -130,-355 -115,-355 -115,-450 -85,-450 -85,-355 -70,-355 -70,-260 ; -20,-262.5 -20,-297.5 15,-297.5 15,-260 ; 70,-260 70,-355 85,-355 85,-450 115,-450 115,-355 130,-355 130,-260 ; -200,120 200,120 ; -200,120 -200,-260 200,-260 200,120 ; -200,120 -200,175 200,175 200,120
  text "1" at -105,-407.5 h20
  text "3" at 90,-409.5 h20
  text "2" at -10,-312.5 h20
  text ".Designator" at -75,-122.5 h30
3D body: height 55, standoff 0.01, extent -200,120 200,175
3D body: height 190, standoff 0.01, extent -200,-260 200,120

## DB714 [mil] ".150x.160x.160\" Mini-Circuits"
height 160
pads (6):
  rect 30x65 smd: 1(-50,62.5) 2(0,62.5) 3(50,62.5) 4(50,-62.5) 5(0,-62.5) 6(-50,-62.5)
Top Overlay:
  rectangle: -93,28 -78,78
  region: -71,73 -71,86 -93,86 -93,73
  lines w5: -80,-70 -80,75 ; 80,-70 80,70
9 Top Assy:
  rectangle: -39,65 -10,70
  rectangle: -75,-25 -60,70
  lines w2: -60,-70 -75,-70 -75,70 -60,70 ; -40,-70 -10,-70 ; -40,-64 -40,-80 -60,-80 -60,-64 ; -40,64 -40,80 -60,80 -60,64 ; -40,70 -10,70 ; -10,-64 -10,-80 10,-80 10,-64 ; -10,64 -10,80 10,80 10,64 ; 10,-70 40,-70 ; 10,70 40,70 ; 40,-64 40,-80 60,-80 60,-64 ; 40,64 40,80 60,80 60,64 ; 60,-70 75,-70 75,70 60,70 ; -60,-64 -60,64 ; -60,-64 60,-64 ; -60,64 60,64 ; 60,-64 60,64
  text ".Designator" at 15,-58 h33
3D body: height 160, standoff 0, extent -100,-105 100,105

## DCB_LINEAR [mm] "SON, 6-Leads, Body 2x3mm, Pitch 0.5mm, Thermal Pad 1.35x1.65mm"
height 0.75
pads (7):
  rect 0.7x0.25 smd mask+0.051: 1(-1.425,0.5) 2(-1.425,0) 3(-1.425,-0.5) 4(1.425,-0.5) 5(1.425,0) 6(1.425,0.5)
  rect 1.65x1.35 smd mask+0.051: 7(0,0)
Top Overlay:
  circle w0.203: c-1.753,1.397 r0.102
  lines w0.2: -1.55,-1.025 -1.55,-1.05 -1.175,-1.05 ; -1.391,1.05 -1.016,1.05 ; 1.175,-1.05 1.55,-1.05 1.55,-1.025 ; 1.175,1.05 1.55,1.05 1.55,1.025
9 Top Assy:
  circle w0.203: c-1.092,0.61 r0.102
  lines w0.051: -1.5,-1 -1.5,1 1.5,1 1.5,-1 -1.5,-1
  text ".Designator" at 0.254,-0.762 h0.51
15 Top Optical Placement:
  lines w0.05: -1.875,-1.15 1.875,-1.15 1.875,1.15 -1.875,1.15 -1.875,-1.15
  lines w0.1: -0.5,0 0.5,0 ; 0,-0.5 0,0.5
3D body: height 0.75, standoff 0, extent -1.5,-1 1.5,1

## DCK-TI [mm] "PSOP-6, TI DCK (R-PDSO-G6), High Density"
height 1.1
pads (6):
  rect 1.2x0.35 smd: 1(-0.8,0.65) 2(-0.8,0) 3(-0.8,-0.65) 4(0.8,-0.65) 5(0.8,0) 6(0.8,0.65)
Top Overlay:
  circle w0.25: c-0.8,1.375 r0.125
  lines w0.127: -0.2,-1.1 0.2,-1.1 ; -0.2,1.1 0.2,1.1
9 Top Assy:
  lines w0.051: -0.7,-1.1 -0.7,1.1 0.7,1.1 0.7,-1.1 -0.7,-1.1
  text ".Designator" at 1.425,-1.125 h0.64
15 Top Optical Placement:
  lines w0.051: -1.5,-1.2 -1.5,1.2 1.5,1.2 1.5,-1.2 -1.5,-1.2
  lines w0.1: -0.5,0 0.5,0 ; 0,-0.5 0,0.5
3D body: height 1.1, standoff 0, extent -0.7,-1.1 0.7,1.1

## DCU-TI [mm] "old part"
height 0.9
pads (8):
  rect 0.8x0.3 smd mask+0.05: 1(-1.55,0.75) 2(-1.55,0.25) 3(-1.55,-0.25) 4(-1.55,-0.75) 5(1.55,-0.75) 6(1.55,-0.25) 7(1.55,0.25) 8(1.55,0.75)
Top Layer:
  pour cut-out: -0.894,-0.345 -0.894,-0.599 -1.549,-0.599 -1.549,-0.899 -0.897,-0.899 -0.897,-1.153 -2.184,-1.153 -2.184,-0.345
Top Overlay:
  circle w0.254: c-2.54,1.016 r0.127
  lines w0.127: -0.508,-1.27 0.508,-1.27 ; -0.508,1.27 0.508,1.27
9 Top Assy:
  rectangle: -1.2,0.254 -0.381,1.05
  lines w0.025: -1.4,-0.875 -1.4,-0.625 ; -1.4,-0.375 -1.4,-0.125 ; -1.4,0.125 -1.4,0.375 ; -1.4,0.625 -1.4,0.875 ; -1.2,-0.875 -1.6,-0.875 -1.6,-0.625 -1.2,-0.625 ; -1.2,-0.375 -1.6,-0.375 -1.6,-0.125 -1.2,-0.125 ; -1.2,0.125 -1.6,0.125 -1.6,0.375 -1.2,0.375 ; -1.2,0.625 -1.6,0.625 -1.6,0.875 -1.2,0.875 ; 1.2,-0.875 1.6,-0.875 1.6,-0.625 1.2,-0.625 ; 1.2,-0.375 1.6,-0.375 1.6,-0.125 1.2,-0.125 ; 1.2,0.125 1.6,0.125 1.6,0.375 1.2,0.375 ; 1.2,0.625 1.6,0.625 1.6,0.875 1.2,0.875 ; 1.4,-0.875 1.4,-0.625 ; 1.4,-0.375 1.4,-0.125 ; 1.4,0.125 1.4,0.375 ; 1.4,0.625 1.4,0.875
  lines w0.051: -1.2,-1.05 -1.2,1.05 1.2,1.05 1.2,-1.05 -1.2,-1.05
  text ".Designator" at -1.28,-1.067 h0.71
3D body: height 0.9, standoff 0, extent -1.2,-1.05 1.2,1.05

## DFN14-LINEAR [mm] "14-Lead Plastic DFN (4mm × 3mm)"
height 0.8
pads (15):
  rect 0.7x0.25 smd mask+0.051: 1(-1.45,1.5) 2(-1.45,1) 3(-1.45,0.5) 4(-1.45,0) 5(-1.45,-0.5) 6(-1.45,-1) 7(-1.45,-1.5) 8(1.45,-1.5) 9(1.45,-1) 10(1.45,-0.5) 11(1.45,0) 12(1.45,0.5) 13(1.45,1) 14(1.45,1.5)
  rect 1.7x3.3 smd mask-0.051: 15(0,0)
Top Overlay:
  circle w0.203: c-2.083,2.057 r0.102
  lines w0.127: -1.676,-1.919 -1.676,-2.159 1.676,-2.159 1.676,-1.897 ; -1.676,1.913 -1.676,2.159 1.676,2.159 1.676,1.913
9 Top Assy:
  circle w0.254: c-0.976,1.522 r0.127
  lines w0.051: -1.5,-2 -1.5,2 1.5,2 1.5,-2 -1.5,-2
  text ".Designator" at 0.229,-1.626 h0.64
3D body: height 0.8, standoff 0.01, extent -1.5,-2 1.5,2